# Altium schematic symbol library 13-Logicold 逻辑 IC.SchLib: 297 symbols (part 24 of 30)
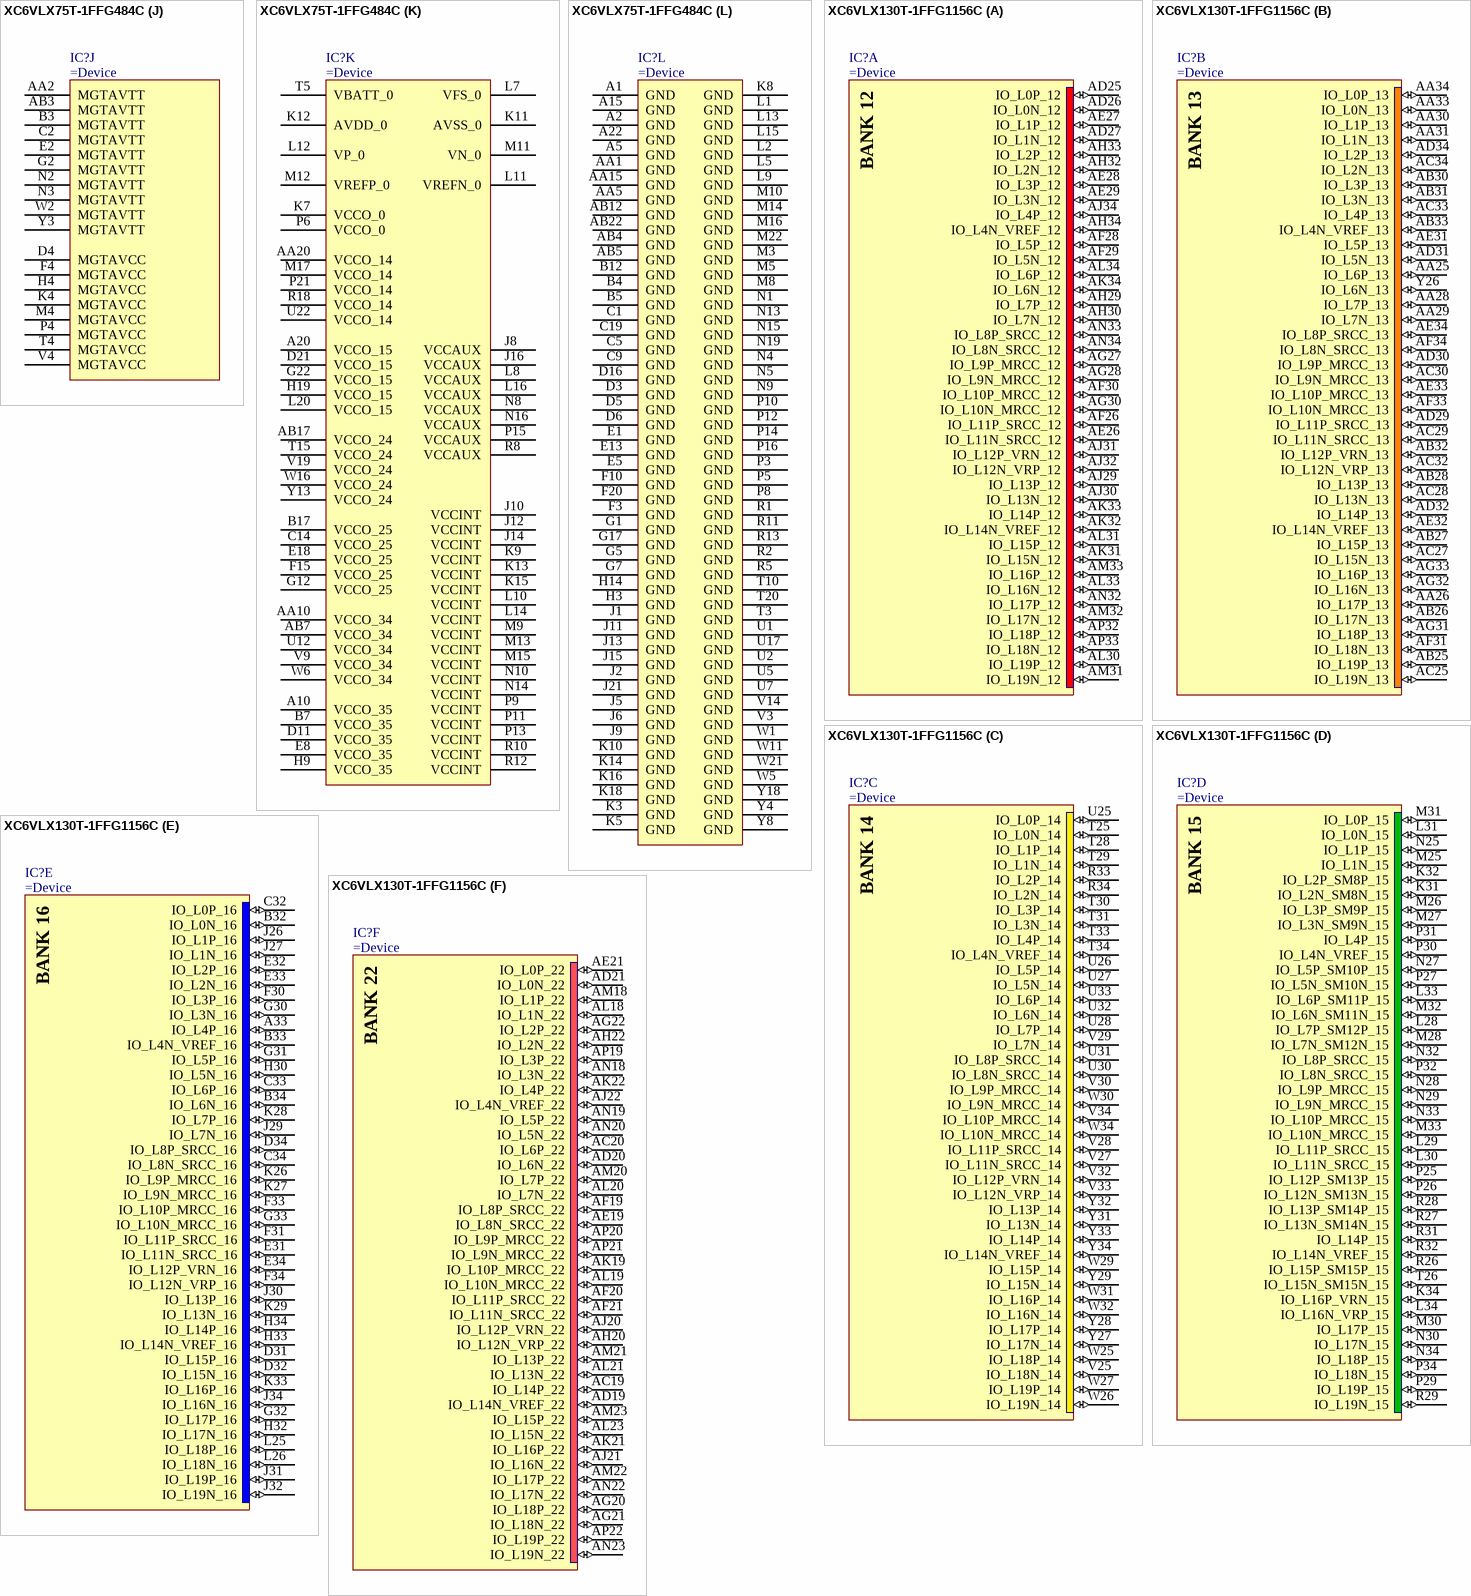
[diagram p185: symbols XC6VLX75T-1FFG484C to XC6VLX130T-1FFG1156C]

## XC6VLX75T-1FFG484C
designator IC?
Virtex-6 LXT Platform FPGA, 240 User I/Os, 8 GTXs, 484-Ball FFBGA, Speed Grade 1, Commercial Grade, Pb-Free
part A pins: AA21 IO_L15P_14 (io), AA22 IO_L14N_VREF_14 (io), AB20 IO_L16P_14 (io), AB21 IO_L16N_14 (io), L21 IO_L3N_14 (io), L22 IO_L3P_14 (io), M18 IO_L0P_14 (io), M19 IO_L1N_14 (io), M20 IO_L1P_14 (io), M21 IO_L7P_14 (io), N17 IO_L6P_14 (io), N18 IO_L0N_14 (io), N20 IO_L7N_14 (io), N21 IO_L2N_14 (io), N22 IO_L2P_14 (io), P17 IO_L6N_14 (io), P18 IO_L12P_VRN_14 (io), P19 IO_L9P_MRCC_14 (io), P20 IO_L9N_MRCC_14 (io), P22 IO_L4P_14 (io), R17 IO_L12N_VRP_14 (io), R19 IO_L11P_SRCC_14 (io), R20 IO_L11N_SRCC_14 (io), R21 IO_L5P_14 (io), R22 IO_L4N_VREF_14 (io), T18 IO_L17P_14 (io), T19 IO_L17N_14 (io), T21 IO_L8N_SRCC_14 (io), T22 IO_L5N_14 (io), U19 IO_L13P_14 (io), U20 IO_L13N_14 (io), U21 IO_L8P_SRCC_14 (io), V20 IO_L19P_14 (io), V21 IO_L19N_14 (io), V22 IO_L10N_MRCC_14 (io), W20 IO_L18N_14 (io), W22 IO_L10P_MRCC_14 (io), Y20 IO_L18P_14 (io), Y21 IO_L15N_14 (io), Y22 IO_L14P_14 (io)
part B pins: A21 IO_L2P_SM8P_15 (io), B20 IO_L0P_15 (io), B21 IO_L2N_SM8N_15 (io), B22 IO_L5P_SM10P_15 (io), C20 IO_L0N_15 (io), C21 IO_L5N_SM10N_15 (io), C22 IO_L10P_MRCC_15 (io), D19 IO_L7N_SM12N_15 (io), D20 IO_L9P_MRCC_15 (io), D22 IO_L10N_MRCC_15 (io), E19 IO_L7P_SM12P_15 (io), E20 IO_L9N_MRCC_15 (io), E21 IO_L11P_SRCC_15 (io), E22 IO_L11N_SRCC_15 (io), F18 IO_L1N_15 (io), F19 IO_L3N_SM9N_15 (io), F21 IO_L12P_SM13P_15 (io), F22 IO_L12N_SM13N_15 (io), G18 IO_L1P_15 (io), G19 IO_L3P_SM9P_15 (io), G20 IO_L17N_15 (io), G21 IO_L15P_SM15P_15 (io), H17 IO_L14P_15 (io), H18 IO_L14N_VREF_15 (io), H20 IO_L17P_15 (io), H21 IO_L15N_SM15N_15 (io), H22 IO_L18N_15 (io), J17 IO_L4N_VREF_15 (io), J18 IO_L4P_15 (io), J19 IO_L8N_SRCC_15 (io), J20 IO_L13P_SM14P_15 (io), J22 IO_L18P_15 (io), K17 IO_L6P_SM11P_15 (io), K19 IO_L8P_SRCC_15 (io), K20 IO_L13N_SM14N_15 (io), K21 IO_L19P_15 (io), K22 IO_L19N_15 (io), L17 IO_L6N_SM11N_15 (io), L18 IO_L16P_VRN_15 (io), L19 IO_L16N_VRP_15 (io)
part C pins: AA13 IO_L16N_CSO_B_24 (io), AA14 IO_L18N_24 (io), AA16 IO_L11P_SRCC_24 (io), AA17 IO_L10N_MRCC_24 (io), AA18 IO_L8N_SRCC_24 (io), AA19 IO_L9P_MRCC_24 (io), AB13 IO_L16P_RS0_24 (io), AB14 IO_L18P_24 (io), AB15 IO_L19P_24 (io), AB16 IO_L19N_24 (io), AB18 IO_L8P_SRCC_24 (io), AB19 IO_L9N_MRCC_24 (io), R14 IO_L12P_D3_24 (io), R15 IO_L12N_D2_FS2_24 (io), R16 IO_L2N_D14_24 (io), T13 IO_L0P_GC_24 (io), T14 IO_L15P_FWE_B_24 (io), T16 IO_L2P_D15_24 (io), T17 IO_L1P_GC_24 (io), U13 IO_L0N_GC_24 (io), U14 IO_L15N_RS1_24 (io), U15 IO_L13P_D1_FS1_24 (io), U16 IO_L6N_D6_24 (io), U18 IO_L1N_GC_24 (io), V13 IO_L4P_D11_24 (io), V15 IO_L13N_D0_FS0_24 (io), V16 IO_L6P_D7_24 (io), V17 IO_L3P_D13_24 (io), V18 IO_L3N_D12_24 (io), W13 IO_L4N_VREF_D10_24 (io), W14 IO_L17N_VRP_24 (io), W15 IO_L14P_FCS_B_24 (io), W17 IO_L5N_D8_24 (io), W18 IO_L5P_D9_24 (io), W19 IO_L7P_D5_24 (io), Y14 IO_L17P_VRN_24 (io), Y15 IO_L14N_VREF_FOE_B_MOSI_24 (io), Y16 IO_L11N_SRCC_24 (io), Y17 IO_L10P_MRCC_24 (io), Y19 IO_L7N_D4_24 (io)
part D pins: A13 IO_L12P_25 (io), A14 IO_L2P_25 (io), A16 IO_L5P_25 (io), A17 IO_L7P_25 (io), A18 IO_L7N_25 (io), A19 IO_L10P_MRCC_25 (io), B13 IO_L12N_25 (io), B14 IO_L2N_25 (io), B15 IO_L1P_25 (io), B16 IO_L5N_25 (io), B18 IO_L13P_25 (io), B19 IO_L10N_MRCC_25 (io), C13 IO_L8P_SRCC_25 (io), C15 IO_L1N_25 (io), C16 IO_L11P_SRCC_25 (io), C17 IO_L11N_SRCC_25 (io), C18 IO_L13N_25 (io), D13 IO_L8N_SRCC_25 (io), D14 IO_L0P_25 (io), D15 IO_L3P_25 (io), D17 IO_L17P_25 (io), D18 IO_L17N_25 (io), E12 IO_L6N_25 (io), E14 IO_L0N_25 (io), E15 IO_L3N_25 (io), E16 IO_L9P_MRCC_25 (io), E17 IO_L19P_GC_25 (io), F12 IO_L6P_25 (io), F13 IO_L4P_25 (io), F14 IO_L14N_VREF_25 (io), F16 IO_L9N_MRCC_25 (io), F17 IO_L19N_GC_25 (io), G13 IO_L4N_VREF_25 (io), G14 IO_L14P_25 (io), G15 IO_L18P_GC_25 (io), G16 IO_L15P_25 (io), H12 IO_L16P_VRN_25 (io), H13 IO_L16N_VRP_25 (io), H15 IO_L18N_GC_25 (io), H16 IO_L15N_25 (io)
part E pins: AA6 IO_L8N_SRCC_34 (io), AA7 IO_L9P_MRCC_34 (io), AA8 IO_L9N_MRCC_34 (io), AA9 IO_L10P_MRCC_34 (io), AA11 IO_L18P_A17_34 (io), AA12 IO_L16N_A20_34 (io), AB6 IO_L8P_SRCC_34 (io), AB8 IO_L15N_A22_34 (io), AB9 IO_L15P_A23_34 (io), AB10 IO_L19N_VRP_34 (io), AB11 IO_L19P_VRN_34 (io), R9 IO_L2P_A15_D31_34 (io), T6 IO_L1P_GC_34 (io), T7 IO_L1N_GC_34 (io), T8 IO_L2N_A14_D30_34 (io), T9 IO_L13P_A01_D17_34 (io), T11 IO_L4N_VREF_A10_D26_34 (io), T12 IO_L4P_A11_D27_34 (io), U6 IO_L3P_A13_D29_34 (io), U8 IO_L6N_A06_D22_34 (io), U9 IO_L11N_SRCC_34 (io), U10 IO_L13N_A00_D16_34 (io), U11 IO_L17P_A19_34 (io), V6 IO_L3N_A12_D28_34 (io), V7 IO_L5P_A09_D25_34 (io), V8 IO_L6P_A07_D23_34 (io), V10 IO_L11P_SRCC_34 (io), V11 IO_L17N_A18_34 (io), V12 IO_L0P_GC_34 (io), W7 IO_L5N_A08_D24_34 (io), W8 IO_L12N_A02_D18_34 (io), W9 IO_L12P_A03_D19_34 (io), W10 IO_L14P_A25_34 (io), W12 IO_L0N_GC_34 (io), Y6 IO_L7P_A05_D21_34 (io), Y7 IO_L7N_A04_D20_34 (io), Y9 IO_L10N_MRCC_34 (io), Y10 IO_L14N_VREF_A24_34 (io), Y11 IO_L18N_A16_34 (io), Y12 IO_L16P_A21_34 (io)
part F pins: A6 IO_L6N_SM3N_35 (io), A7 IO_L6P_SM3P_35 (io), A8 IO_L5P_SM2P_35 (io), A9 IO_L3P_SM1P_35 (io), A11 IO_L0N_35 (io), A12 IO_L0P_35 (io), B6 IO_L7N_SM4N_35 (io), B8 IO_L5N_SM2N_35 (io), B9 IO_L3N_SM1N_35 (io), B10 IO_L1P_35 (io), B11 IO_L2N_SM0N_35 (io), C6 IO_L7P_SM4P_35 (io), C7 IO_L10N_MRCC_35 (io), C8 IO_L10P_MRCC_35 (io), C10 IO_L1N_35 (io), C11 IO_L2P_SM0P_35 (io), C12 IO_L18N_GC_35 (io), D7 IO_L11N_SRCC_35 (io), D8 IO_L11P_SRCC_35 (io), D9 IO_L9N_MRCC_35 (io), D10 IO_L4P_35 (io), D12 IO_L18P_GC_35 (io), E6 IO_L13N_SM6N_35 (io), E7 IO_L13P_SM6P_35 (io), E9 IO_L9P_MRCC_35 (io), E10 IO_L4N_VREF_35 (io), E11 IO_L14P_35 (io), F6 IO_L19P_GC_35 (io), F7 IO_L15N_SM7N_35 (io), F8 IO_L15P_SM7P_35 (io), F9 IO_L12P_SM5P_35 (io), F11 IO_L14N_VREF_35 (io), G6 IO_L19N_GC_35 (io), G8 IO_L17P_35 (io), G9 IO_L12N_SM5N_35 (io), G10 IO_L8P_SRCC_35 (io), G11 IO_L16P_VRN_35 (io), H8 IO_L17N_35 (io), H10 IO_L8N_SRCC_35 (io), H11 IO_L16N_VRP_35 (io)
part G pins: F5 PROGRAM_B_0 (in), H5 INIT_B_0 (io), H6 M2_0 (in), H7 M0_0 (in), J7 M1_0 (in), K6 DONE_0 (io), L6 HSWAPEN_0 (in), M6 CCLK_0 (io), M7 CSI_B_0 (in), N6 DOUT_BUSY_0 (out), N7 TMS_0 (in), N11 DXN_0, N12 DXP_0, P7 TDI_0 (in), R6 TCK_0 (in), R7 TDO_0 (out), V5 RDWR_B_0 (in), Y5 DIN_0 (in)
part H pins: AA3 MGTRXP1_114 (in), AA4 MGTRXN1_114 (in), AB1 MGTRXP0_114 (in), AB2 MGTRXN0_114 (in), M1 MGTTXP3_114 (out), M2 MGTTXN3_114 (out), P1 MGTTXP2_114 (out), P2 MGTTXN2_114 (out), R3 MGTREFCLK1N_114 (in), R4 MGTREFCLK1P_114 (in), T1 MGTTXP1_114 (out), T2 MGTTXN1_114 (out), U3 MGTREFCLK0N_114 (in), U4 MGTREFCLK0P_114 (in), V1 MGTTXP0_114 (out), V2 MGTTXN0_114 (out), W3 MGTRXP3_114 (in), W4 MGTRXN3_114 (in), Y1 MGTRXP2_114 (in), Y2 MGTRXN2_114 (in)
part I pins: A3 MGTRREF_115, A4 MGTAVTTRCAL_115, B1 MGTRXP3_115 (in), B2 MGTRXN3_115 (in), C3 MGTRXP2_115 (in), C4 MGTRXN2_115 (in), D1 MGTTXP3_115 (out), D2 MGTTXN3_115 (out), E3 MGTRXP1_115 (in), E4 MGTRXN1_115 (in), F1 MGTTXP2_115 (out), F2 MGTTXN2_115 (out), G3 MGTRXP0_115 (in), G4 MGTRXN0_115 (in), H1 MGTTXP1_115 (out), H2 MGTTXN1_115 (out), J3 MGTREFCLK1N_115 (in), J4 MGTREFCLK1P_115 (in), K1 MGTTXP0_115 (out), K2 MGTTXN0_115 (out), L3 MGTREFCLK0N_115 (in), L4 MGTREFCLK0P_115 (in)
part J pins: AA2 MGTAVTT (power), AB3 MGTAVTT (power), B3 MGTAVTT (power), C2 MGTAVTT (power), D4 MGTAVCC (power), E2 MGTAVTT (power), F4 MGTAVCC (power), G2 MGTAVTT (power), H4 MGTAVCC (power), K4 MGTAVCC (power), M4 MGTAVCC (power), N2 MGTAVTT (power), N3 MGTAVTT (power), P4 MGTAVCC (power), T4 MGTAVCC (power), V4 MGTAVCC (power), W2 MGTAVTT (power), Y3 MGTAVTT (power)
part K pins: A10 VCCO_35 (power), A20 VCCO_15 (power), AA10 VCCO_34 (power), AA20 VCCO_14 (power), AB7 VCCO_34 (power), AB17 VCCO_24 (power), B7 VCCO_35 (power), B17 VCCO_25 (power), C14 VCCO_25 (power), D11 VCCO_35 (power), D21 VCCO_15 (power), E8 VCCO_35 (power), E18 VCCO_25 (power), F15 VCCO_25 (power), G12 VCCO_25 (power), G22 VCCO_15 (power), H9 VCCO_35 (power), H19 VCCO_15 (power), J8 VCCAUX (power), J10 VCCINT (power), J12 VCCINT (power), J14 VCCINT (power), J16 VCCAUX (power), K7 VCCO_0 (power), K9 VCCINT (power), K11 AVSS_0 (power), K12 AVDD_0 (power), K13 VCCINT (power), K15 VCCINT (power), L7 VFS_0 (power), L8 VCCAUX (power), L10 VCCINT (power), L11 VREFN_0 (power), L12 VP_0 (power), L14 VCCINT (power), L16 VCCAUX (power), L20 VCCO_15 (power), M9 VCCINT (power), M11 VN_0 (power), M12 VREFP_0 (power), M13 VCCINT (power), M15 VCCINT (power), M17 VCCO_14 (power), N8 VCCAUX (power), N10 VCCINT (power), N14 VCCINT (power), N16 VCCAUX (power), P6 VCCO_0 (power), P9 VCCINT (power), P11 VCCINT (power), P13 VCCINT (power), P15 VCCAUX (power), P21 VCCO_14 (power), R8 VCCAUX (power), R10 VCCINT (power), R12 VCCINT (power), R18 VCCO_14 (power), T5 VBATT_0 (power), T15 VCCO_24 (power), U12 VCCO_34 (power), U22 VCCO_14 (power), V9 VCCO_34 (power), V19 VCCO_24 (power), W6 VCCO_34 (power), W16 VCCO_24 (power), Y13 VCCO_24 (power)
part L pins: A1 GND (power), A2 GND (power), A5 GND (power), A15 GND (power), A22 GND (power), AA1 GND (power), AA5 GND (power), AA15 GND (power), AB4 GND (power), AB5 GND (power), AB12 GND (power), AB22 GND (power), B4 GND (power), B5 GND (power), B12 GND (power), C1 GND (power), C5 GND (power), C9 GND (power), C19 GND (power), D3 GND (power), D5 GND (power), D6 GND (power), D16 GND (power), E1 GND (power), E5 GND (power), E13 GND (power), F3 GND (power), F10 GND (power), F20 GND (power), G1 GND (power), G5 GND (power), G7 GND (power), G17 GND (power), H3 GND (power), H14 GND (power), J1 GND (power), J2 GND (power), J5 GND (power), J6 GND (power), J9 GND (power), J11 GND (power), J13 GND (power), J15 GND (power), J21 GND (power), K3 GND (power), K5 GND (power), K8 GND (power), K10 GND (power), K14 GND (power), K16 GND (power), K18 GND (power), L1 GND (power), L2 GND (power), L5 GND (power), L9 GND (power), L13 GND (power), L15 GND (power), M3 GND (power), M5 GND (power), M8 GND (power), M10 GND (power), M14 GND (power), M16 GND (power), M22 GND (power), N1 GND (power), N4 GND (power), N5 GND (power), N9 GND (power), N13 GND (power), N15 GND (power), N19 GND (power), P3 GND (power), P5 GND (power), P8 GND (power), P10 GND (power), P12 GND (power), P14 GND (power), P16 GND (power), R1 GND (power), R2 GND (power), R5 GND (power), R11 GND (power), R13 GND (power), T3 GND (power), T10 GND (power), T20 GND (power), U1 GND (power), U2 GND (power), U5 GND (power), U7 GND (power), U17 GND (power), V3 GND (power), V14 GND (power), W1 GND (power), W5 GND (power), W11 GND (power), W21 GND (power), Y4 GND (power), Y8 GND (power), Y18 GND (power)
part A text: BANK 14
part B text: BANK 15
part C text: BANK 24
part D text: BANK 25
part E text: BANK 34
part F text: BANK 35

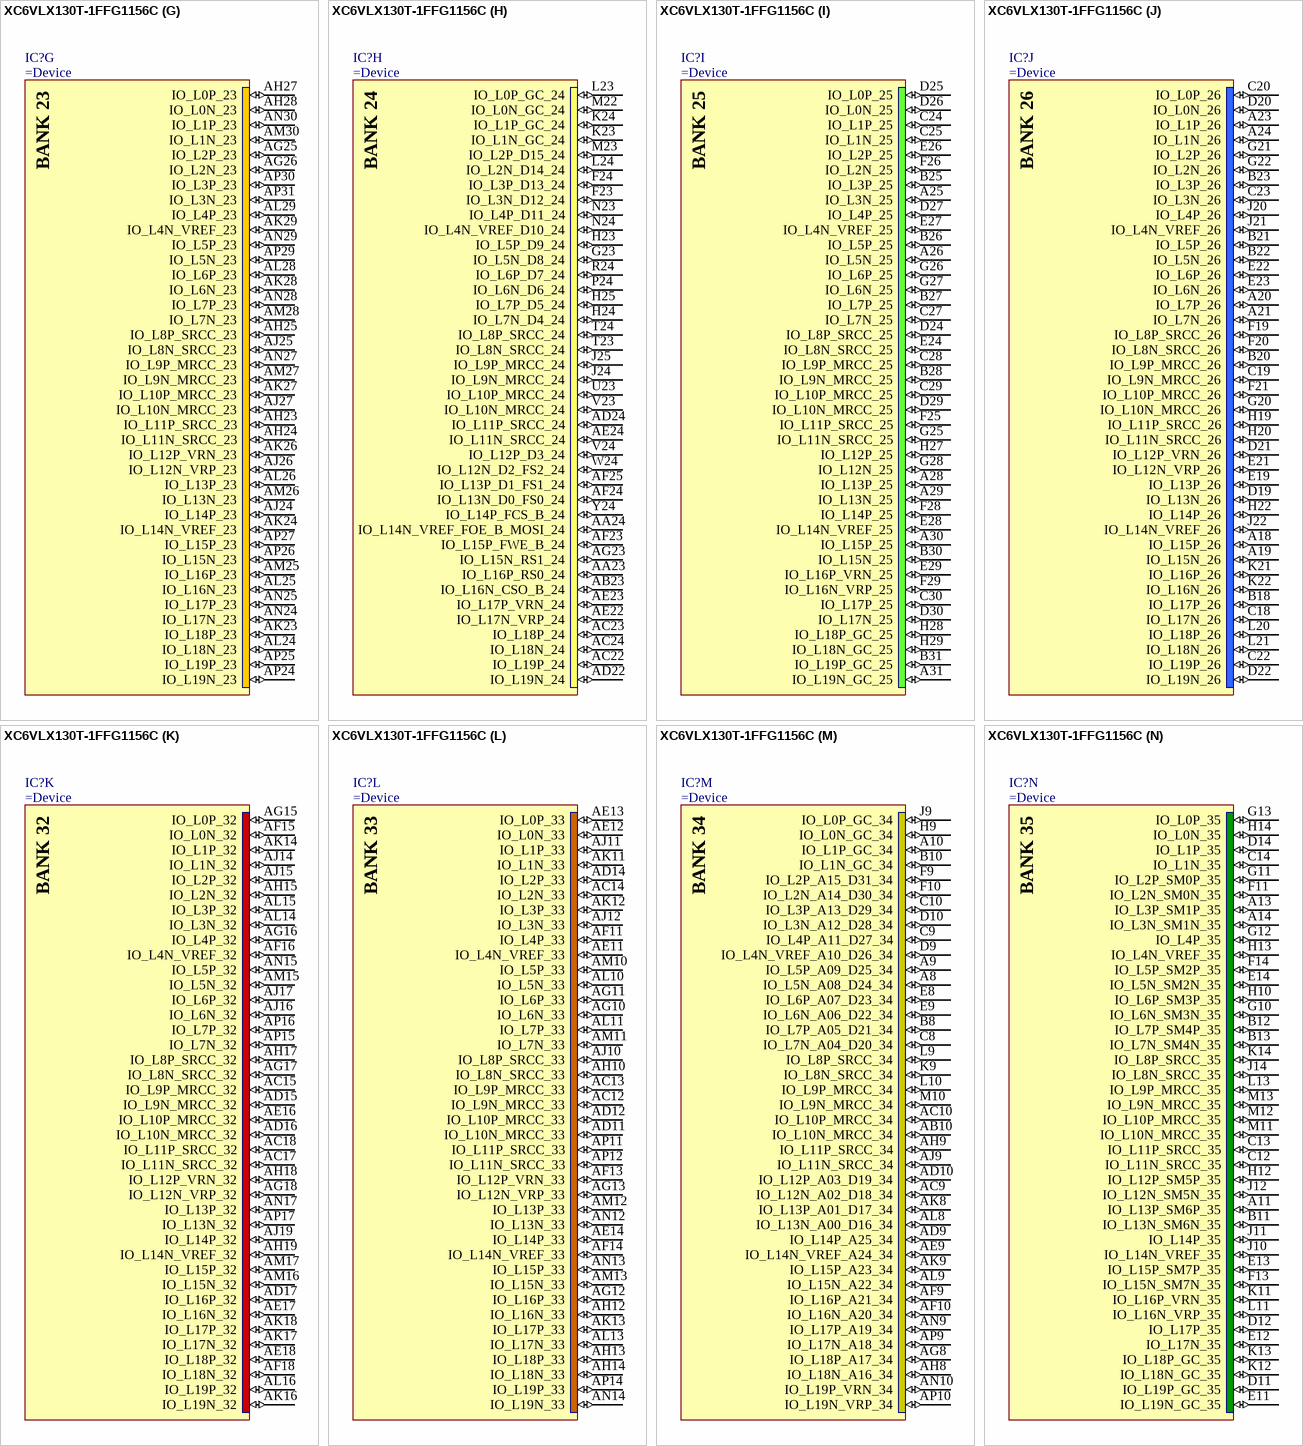
[diagram p129: symbol XC6VLX130T-1FFG1156C]

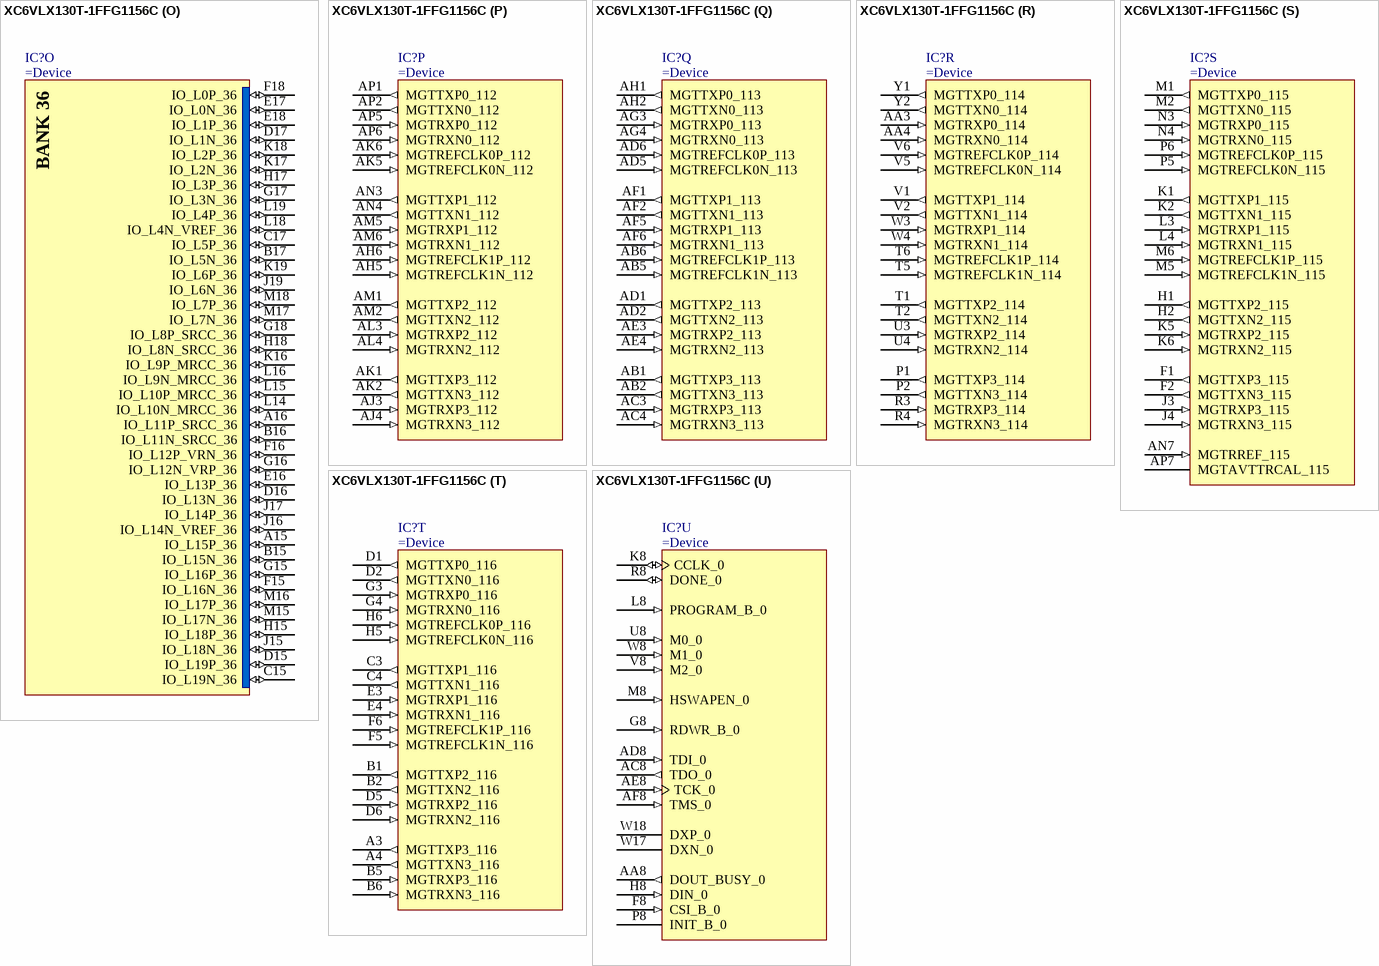
[diagram p130: symbol XC6VLX130T-1FFG1156C]

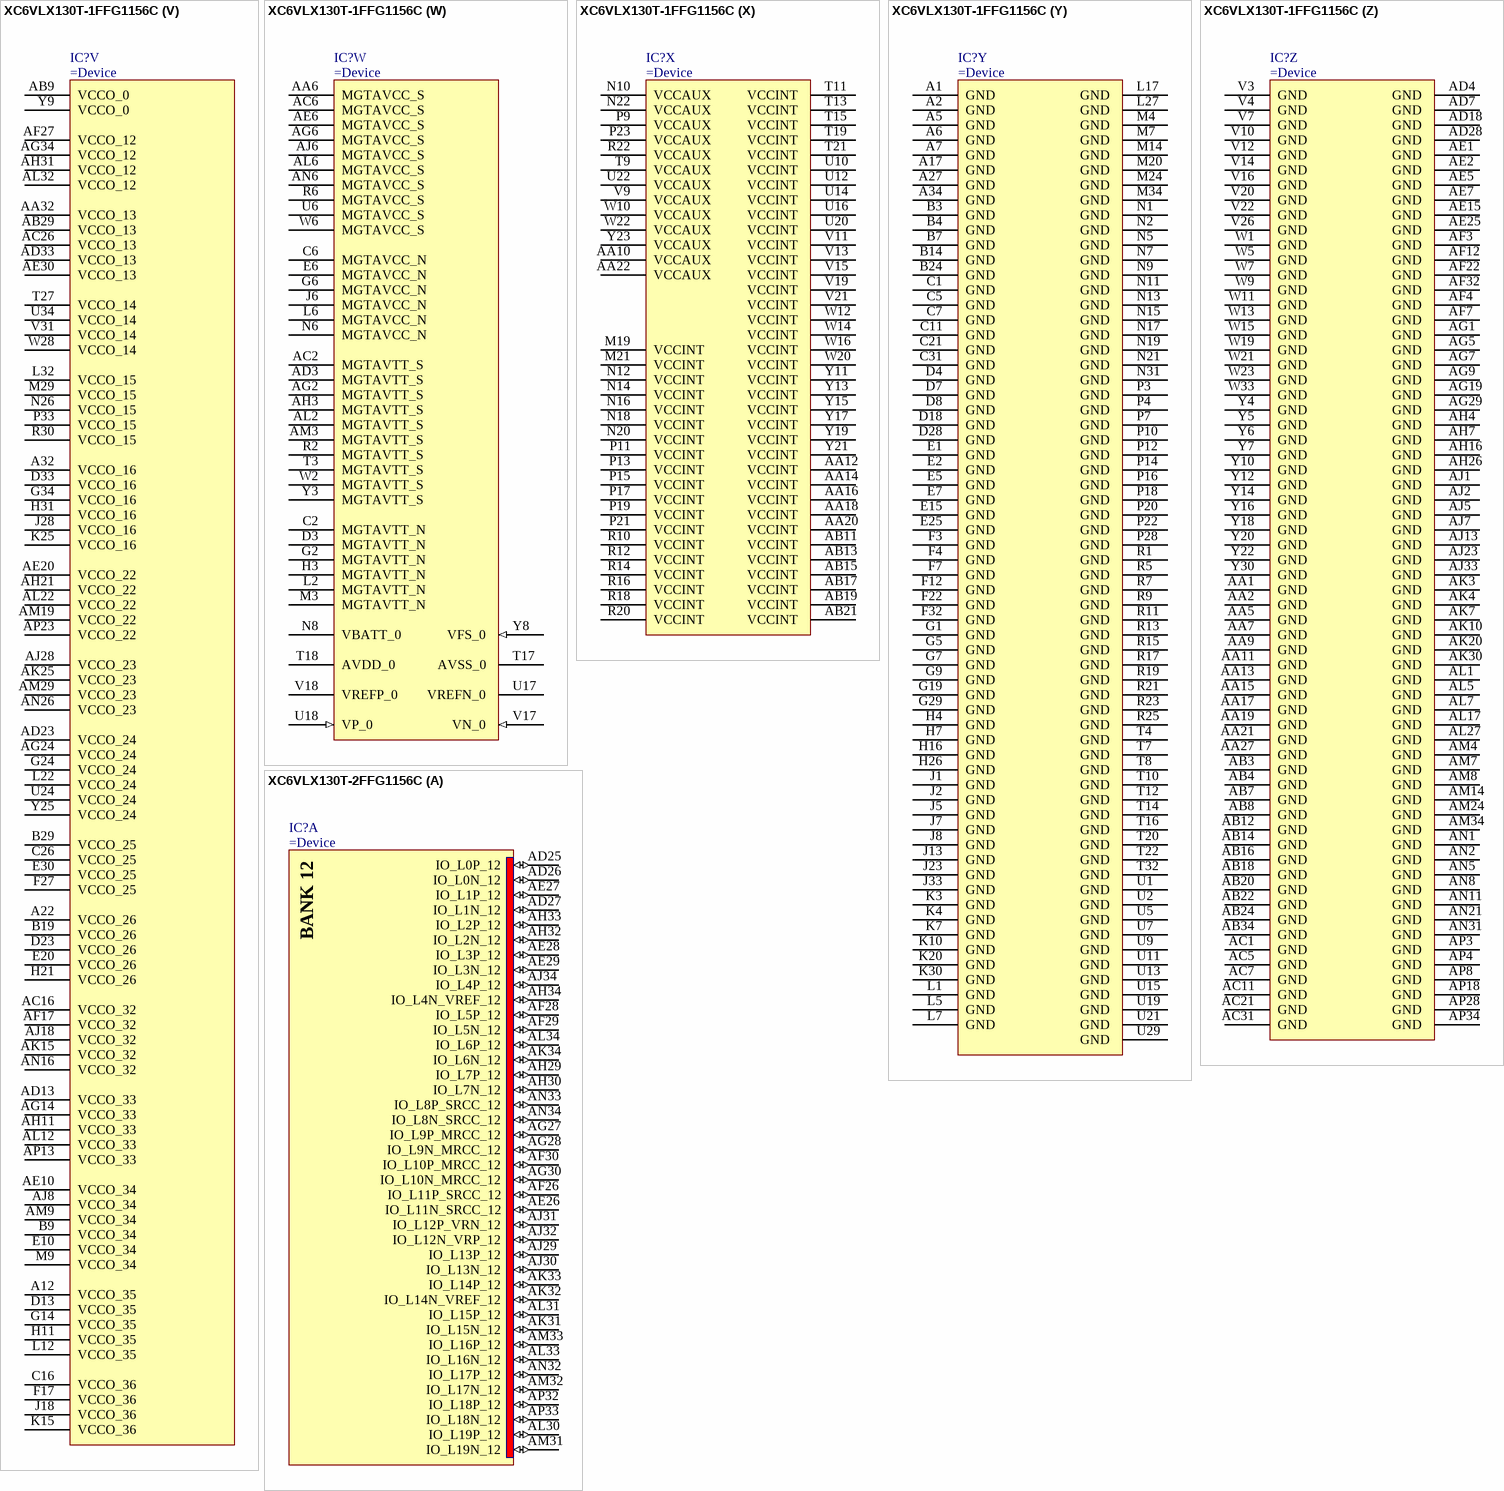
[diagram p131: symbols XC6VLX130T-1FFG1156C to XC6VLX130T-2FFG1156C]

## XC6VLX130T-1FFG1156C
designator IC?
Virtex-6 FPGA, 20 GTXs, 600 User I/Os, 1156-Pin BGA, Speed Grade 1, Commercial, Pb-Free
part A pins: AD25 IO_L0P_12  (io), AD26 IO_L0N_12  (io), AD27 IO_L1N_12  (io), AE26 IO_L11N_SRCC_12  (io), AE27 IO_L1P_12  (io), AE28 IO_L3P_12  (io), AE29 IO_L3N_12  (io), AF26 IO_L11P_SRCC_12  (io), AF28 IO_L5P_12  (io), AF29 IO_L5N_12  (io), AF30 IO_L10P_MRCC_12  (io), AG27 IO_L9P_MRCC_12  (io), AG28 IO_L9N_MRCC_12  (io), AG30 IO_L10N_MRCC_12  (io), AH29 IO_L7P_12  (io), AH30 IO_L7N_12  (io), AH32 IO_L2N_12  (io), AH33 IO_L2P_12  (io), AH34 IO_L4N_VREF_12  (io), AJ29 IO_L13P_12  (io), AJ30 IO_L13N_12  (io), AJ31 IO_L12P_VRN_12  (io), AJ32 IO_L12N_VRP_12  (io), AJ34 IO_L4P_12  (io), AK31 IO_L15N_12  (io), AK32 IO_L14N_VREF_12  (io), AK33 IO_L14P_12  (io), AK34 IO_L6N_12  (io), AL30 IO_L19P_12  (io), AL31 IO_L15P_12  (io), AL33 IO_L16N_12  (io), AL34 IO_L6P_12  (io), AM31 IO_L19N_12  (io), AM32 IO_L17N_12  (io), AM33 IO_L16P_12  (io), AN32 IO_L17P_12  (io), AN33 IO_L8P_SRCC_12  (io), AN34 IO_L8N_SRCC_12  (io), AP32 IO_L18P_12  (io), AP33 IO_L18N_12  (io)
part B pins: AA25 IO_L6P_13  (io), AA26 IO_L17P_13  (io), AA28 IO_L7P_13  (io), AA29 IO_L7N_13  (io), AA30 IO_L1P_13  (io), AA31 IO_L1N_13  (io), AA33 IO_L0N_13  (io), AA34 IO_L0P_13  (io), AB25 IO_L19P_13  (io), AB26 IO_L17N_13  (io), AB27 IO_L15P_13  (io), AB28 IO_L13P_13  (io), AB30 IO_L3P_13  (io), AB31 IO_L3N_13  (io), AB32 IO_L12P_VRN_13  (io), AB33 IO_L4N_VREF_13  (io), AC25 IO_L19N_13  (io), AC27 IO_L15N_13  (io), AC28 IO_L13N_13  (io), AC29 IO_L11N_SRCC_13  (io), AC30 IO_L9N_MRCC_13  (io), AC32 IO_L12N_VRP_13  (io), AC33 IO_L4P_13  (io), AC34 IO_L2N_13  (io), AD29 IO_L11P_SRCC_13  (io), AD30 IO_L9P_MRCC_13  (io), AD31 IO_L5N_13  (io), AD32 IO_L14P_13  (io), AD34 IO_L2P_13  (io), AE31 IO_L5P_13  (io), AE32 IO_L14N_VREF_13  (io), AE33 IO_L10P_MRCC_13  (io), AE34 IO_L8P_SRCC_13  (io), AF31 IO_L18N_13  (io), AF33 IO_L10N_MRCC_13  (io), AF34 IO_L8N_SRCC_13  (io), AG31 IO_L18P_13  (io), AG32 IO_L16N_13  (io), AG33 IO_L16P_13  (io), Y26 IO_L6N_13  (io)
part C pins: R33 IO_L2P_14  (io), R34 IO_L2N_14  (io), T25 IO_L0N_14  (io), T28 IO_L1P_14  (io), T29 IO_L1N_14  (io), T30 IO_L3P_14  (io), T31 IO_L3N_14  (io), T33 IO_L4P_14  (io), T34 IO_L4N_VREF_14  (io), U25 IO_L0P_14  (io), U26 IO_L5P_14  (io), U27 IO_L5N_14  (io), U28 IO_L7P_14  (io), U30 IO_L8N_SRCC_14  (io), U31 IO_L8P_SRCC_14  (io), U32 IO_L6N_14  (io), U33 IO_L6P_14  (io), V25 IO_L18N_14  (io), V27 IO_L11N_SRCC_14  (io), V28 IO_L11P_SRCC_14  (io), V29 IO_L7N_14  (io), V30 IO_L9P_MRCC_14  (io), V32 IO_L12P_VRN_14  (io), V33 IO_L12N_VRP_14  (io), V34 IO_L10P_MRCC_14  (io), W25 IO_L18P_14  (io), W26 IO_L19N_14  (io), W27 IO_L19P_14  (io), W29 IO_L15P_14  (io), W30 IO_L9N_MRCC_14  (io), W31 IO_L16P_14  (io), W32 IO_L16N_14  (io), W34 IO_L10N_MRCC_14  (io), Y27 IO_L17N_14  (io), Y28 IO_L17P_14  (io), Y29 IO_L15N_14  (io), Y31 IO_L13N_14  (io), Y32 IO_L13P_14  (io), Y33 IO_L14P_14  (io), Y34 IO_L14N_VREF_14  (io)
part D pins: K31 IO_L2N_SM8N_15  (io), K32 IO_L2P_SM8P_15  (io), K34 IO_L16P_VRN_15  (io), L28 IO_L7P_SM12P_15  (io), L29 IO_L11P_SRCC_15  (io), L30 IO_L11N_SRCC_15  (io), L31 IO_L0N_15  (io), L33 IO_L6P_SM11P_15  (io), L34 IO_L16N_VRP_15  (io), M25 IO_L1N_15  (io), M26 IO_L3P_SM9P_15  (io), M27 IO_L3N_SM9N_15  (io), M28 IO_L7N_SM12N_15  (io), M30 IO_L17P_15  (io), M31 IO_L0P_15  (io), M32 IO_L6N_SM11N_15  (io), M33 IO_L10N_MRCC_15  (io), N25 IO_L1P_15  (io), N27 IO_L5P_SM10P_15  (io), N28 IO_L9P_MRCC_15  (io), N29 IO_L9N_MRCC_15  (io), N30 IO_L17N_15  (io), N32 IO_L8P_SRCC_15  (io), N33 IO_L10P_MRCC_15  (io), N34 IO_L18P_15  (io), P25 IO_L12P_SM13P_15  (io), P26 IO_L12N_SM13N_15  (io), P27 IO_L5N_SM10N_15  (io), P29 IO_L19P_15  (io), P30 IO_L4N_VREF_15  (io), P31 IO_L4P_15  (io), P32 IO_L8N_SRCC_15  (io), P34 IO_L18N_15  (io), R26 IO_L15P_SM15P_15  (io), R27 IO_L13N_SM14N_15  (io), R28 IO_L13P_SM14P_15  (io), R29 IO_L19N_15  (io), R31 IO_L14P_15  (io), R32 IO_L14N_VREF_15  (io), T26 IO_L15N_SM15N_15  (io)
part E pins: A33 IO_L4P_16  (io), B32 IO_L0N_16  (io), B33 IO_L4N_VREF_16  (io), B34 IO_L6N_16  (io), C32 IO_L0P_16  (io), C33 IO_L6P_16  (io), C34 IO_L8N_SRCC_16  (io), D31 IO_L15P_16  (io), D32 IO_L15N_16  (io), D34 IO_L8P_SRCC_16  (io), E31 IO_L11N_SRCC_16  (io), E32 IO_L2P_16  (io), E33 IO_L2N_16  (io), E34 IO_L12P_VRN_16  (io), F30 IO_L3P_16  (io), F31 IO_L11P_SRCC_16  (io), F33 IO_L10P_MRCC_16  (io), F34 IO_L12N_VRP_16  (io), G30 IO_L3N_16  (io), G31 IO_L5P_16  (io), G32 IO_L17P_16  (io), G33 IO_L10N_MRCC_16  (io), H30 IO_L5N_16  (io), H32 IO_L17N_16  (io), H33 IO_L14N_VREF_16  (io), H34 IO_L14P_16  (io), J26 IO_L1P_16  (io), J27 IO_L1N_16  (io), J29 IO_L7N_16  (io), J30 IO_L13P_16  (io), J31 IO_L19P_16  (io), J32 IO_L19N_16  (io), J34 IO_L16N_16  (io), K26 IO_L9P_MRCC_16  (io), K27 IO_L9N_MRCC_16  (io), K28 IO_L7P_16  (io), K29 IO_L13N_16  (io), K33 IO_L16P_16  (io), L25 IO_L18P_16  (io), L26 IO_L18N_16  (io)
part F pins: AC19 IO_L14P_22  (io), AC20 IO_L6P_22  (io), AD19 IO_L14N_VREF_22  (io), AD20 IO_L6N_22  (io), AD21 IO_L0N_22  (io), AE19 IO_L8N_SRCC_22  (io), AE21 IO_L0P_22  (io), AF19 IO_L8P_SRCC_22  (io), AF20 IO_L11P_SRCC_22  (io), AF21 IO_L11N_SRCC_22  (io), AG20 IO_L18P_22  (io), AG21 IO_L18N_22  (io), AG22 IO_L2P_22  (io), AH20 IO_L12N_VRP_22  (io), AH22 IO_L2N_22  (io), AJ20 IO_L12P_VRN_22  (io), AJ21 IO_L16N_22  (io), AJ22 IO_L4N_VREF_22  (io), AK19 IO_L10P_MRCC_22  (io), AK21 IO_L16P_22  (io), AK22 IO_L4P_22  (io), AL18 IO_L1N_22  (io), AL19 IO_L10N_MRCC_22  (io), AL20 IO_L7N_22  (io), AL21 IO_L13N_22  (io), AL23 IO_L15N_22  (io), AM18 IO_L1P_22  (io), AM20 IO_L7P_22  (io), AM21 IO_L13P_22  (io), AM22 IO_L17P_22  (io), AM23 IO_L15P_22  (io), AN18 IO_L3N_22  (io), AN19 IO_L5P_22  (io), AN20 IO_L5N_22  (io), AN22 IO_L17N_22  (io), AN23 IO_L19N_22  (io), AP19 IO_L3P_22  (io), AP20 IO_L9P_MRCC_22  (io), AP21 IO_L9N_MRCC_22  (io), AP22 IO_L19P_22  (io)
part G pins: AG25 IO_L2P_23  (io), AG26 IO_L2N_23  (io), AH23 IO_L11P_SRCC_23  (io), AH24 IO_L11N_SRCC_23  (io), AH25 IO_L8P_SRCC_23  (io), AH27 IO_L0P_23  (io), AH28 IO_L0N_23  (io), AJ24 IO_L14P_23  (io), AJ25 IO_L8N_SRCC_23  (io), AJ26 IO_L12N_VRP_23  (io), AJ27 IO_L10N_MRCC_23  (io), AK23 IO_L18P_23  (io), AK24 IO_L14N_VREF_23  (io), AK26 IO_L12P_VRN_23  (io), AK27 IO_L10P_MRCC_23  (io), AK28 IO_L6N_23  (io), AK29 IO_L4N_VREF_23  (io), AL24 IO_L18N_23  (io), AL25 IO_L16N_23  (io), AL26 IO_L13P_23  (io), AL28 IO_L6P_23  (io), AL29 IO_L4P_23  (io), AM25 IO_L16P_23  (io), AM26 IO_L13N_23  (io), AM27 IO_L9N_MRCC_23  (io), AM28 IO_L7N_23  (io), AM30 IO_L1N_23  (io), AN24 IO_L17N_23  (io), AN25 IO_L17P_23  (io), AN27 IO_L9P_MRCC_23  (io), AN28 IO_L7P_23  (io), AN29 IO_L5P_23  (io), AN30 IO_L1P_23  (io), AP24 IO_L19N_23  (io), AP25 IO_L19P_23  (io), AP26 IO_L15N_23  (io), AP27 IO_L15P_23  (io), AP29 IO_L5N_23  (io), AP30 IO_L3P_23  (io), AP31 IO_L3N_23  (io)
part H pins: AA23 IO_L16P_RS0_24  (io), AA24 IO_L14N_VREF_FOE_B_MOSI_24  (io), AB23 IO_L16N_CSO_B_24  (io), AC22 IO_L19P_24  (io), AC23 IO_L18P_24  (io), AC24 IO_L18N_24  (io), AD22 IO_L19N_24  (io), AD24 IO_L11P_SRCC_24  (io), AE22 IO_L17N_VRP_24  (io), AE23 IO_L17P_VRN_24  (io), AE24 IO_L11N_SRCC_24  (io), AF23 IO_L15P_FWE_B_24  (io), AF24 IO_L13N_D0_FS0_24  (io), AF25 IO_L13P_D1_FS1_24  (io), AG23 IO_L15N_RS1_24  (io), F23 IO_L3N_D12_24  (io), F24 IO_L3P_D13_24  (io), G23 IO_L5N_D8_24  (io), H23 IO_L5P_D9_24  (io), H24 IO_L7N_D4_24  (io), H25 IO_L7P_D5_24  (io), J24 IO_L9N_MRCC_24  (io), J25 IO_L9P_MRCC_24  (io), K23 IO_L1N_GC_24  (io), K24 IO_L1P_GC_24  (io), L23 IO_L0P_GC_24  (io), L24 IO_L2N_D14_24  (io), M22 IO_L0N_GC_24  (io), M23 IO_L2P_D15_24  (io), N23 IO_L4P_D11_24  (io), N24 IO_L4N_VREF_D10_24  (io), P24 IO_L6N_D6_24  (io), R24 IO_L6P_D7_24  (io), T23 IO_L8N_SRCC_24  (io), T24 IO_L8P_SRCC_24  (io), U23 IO_L10P_MRCC_24  (io), V23 IO_L10N_MRCC_24  (io), V24 IO_L12P_D3_24  (io), W24 IO_L12N_D2_FS2_24  (io), Y24 IO_L14P_FCS_B_24  (io)